# Altium footprint library Troposphere_lib.PcbLib: 48 footprints (part 2 of 3)
Each footprint in its own frame and in the unit in brackets; x right, y up, seen from the top. Pads: shape width x height; smd on the part's side, far side on the other; paste and mask are expansions set on the pad; w line width, h text height; cw(c..) or ccw(c..) is an arc to the next point about the centre after c.
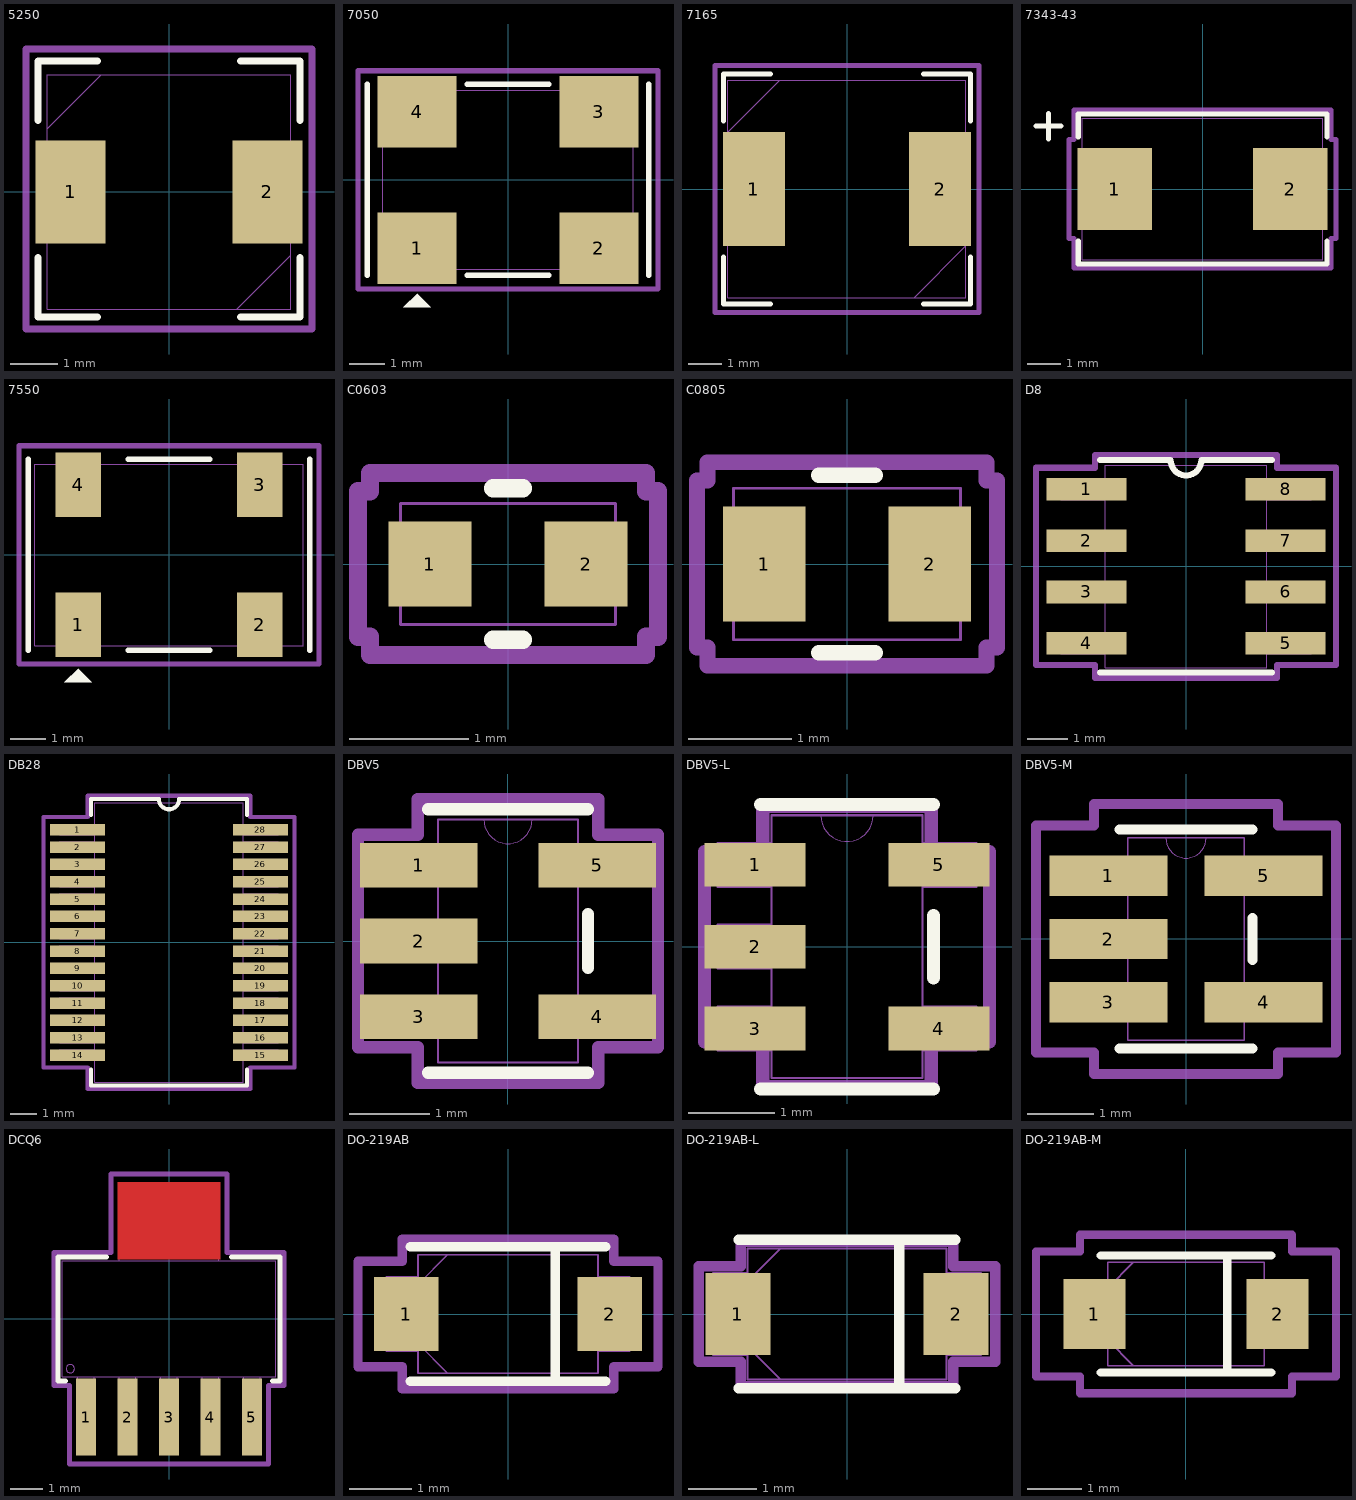
[diagram p1: the footprints below, top view; thin cyan lines are the x and y axes]

## 5250 [mm]
pads (2):
  rect 1.5x2.2 smd mask+0: 1(-2.1,0) 2(2.1,0)
Top Overlay:
  lines w0.152: -2.794,-1.397 -2.794,-2.667 -1.524,-2.667 ; -2.794,1.524 -2.794,2.794 -1.524,2.794 ; 1.524,-2.667 2.794,-2.667 2.794,-1.397 ; 1.524,2.794 2.794,2.794 2.794,1.524
Mechanical 13:
  lines w0.025: -2.6,1.35 -1.45,2.5 ; 1.45,-2.5 2.6,-1.35 ; -2.6,-2.5 2.6,-2.5 2.6,2.5 -2.6,2.5 -2.6,-2.5
Mechanical 15:
  lines w0.152: -3.048,-2.921 -3.048,3.048 3.048,3.048 3.048,-2.921 -3.048,-2.921
3D body: height 3, standoff 0, extent -2.6,-2.5 2.6,2.5

## 7050 [mm]
pads (4):
  rect 2.2x2 smd mask+0: 1(-2.54,-1.905) 2(2.54,-1.905) 3(2.54,1.905) 4(-2.54,1.905)
Top Overlay:
  region: -2.54,-3.175 -2.921,-3.556 -2.159,-3.556
  region: -2.54,-3.175
  lines w0.152: -3.937,-2.667 -3.937,2.667 ; -1.143,-2.667 1.143,-2.667 ; -1.143,2.667 1.143,2.667 ; 3.937,-2.667 3.937,2.667
Mechanical 13:
  lines w0.025: -3.5,-2.5 -3.5,2.5 3.5,2.5 3.5,-2.5 -3.5,-2.5
Mechanical 15:
  lines w0.152: -4.191,-3.048 -4.191,3.048 -3.048,3.048 4.191,3.048 4.191,-3.048 -4.191,-3.048
3D body: height 0.9, standoff 0, extent -3.5,-2.5 3.5,2.5

## 7165 [mm]
pads (2):
  rect 1.85x3.4 smd mask+0: 1(-2.775,0) 2(2.775,0)
Top Overlay:
  lines w0.152: -3.683,-2.032 -3.683,-3.429 -2.286,-3.429 ; -3.683,2.032 -3.683,3.429 -2.286,3.429 ; 2.286,-3.429 3.683,-3.429 3.683,-2.032 ; 2.286,3.429 3.683,3.429 3.683,2.032
Mechanical 13:
  lines w0.025: -3.556,1.7 -2.006,3.25 ; 2,-3.25 3.55,-1.7 ; -3.556,-3.25 -3.556,3.25 3.55,3.25 3.55,-3.25 -3.556,-3.25
Mechanical 15:
  lines w0.152: -3.937,-3.683 3.937,-3.683 3.937,3.683 -3.937,3.683 -3.937,-3.683
3D body: height 3, standoff 0, extent -3.556,-3.25 3.55,3.25

## 7343-43 [mil]
pads (2):
  rect 89x98 smd paste+0 mask+0: 1(-105,0) 2(105,0)
Top Overlay:
  lines w6: -199,75 -169,75 ; -184,60 -184,90 ; -148.5,-62.1 -148.5,-89.5 148.5,-89.5 148.5,-62.1 ; -148.5,62.1 -148.5,89.5 148.5,89.5 148.5,62.1
Mechanical 13:
  lines w1: -199,75 -169,75 ; -184,60 -184,90 ; -143.5,-84.5 143.5,-84.5 143.5,84.5 -143.5,84.5 -143.5,-84.5
Mechanical 15:
  lines w6: -159.5,-59 -159.5,59 -153.5,59 -153.5,94.5 153.5,94.5 153.5,59 159.5,59 159.5,-59 153.5,-59 153.5,-94.5 -153.5,-94.5 -153.5,-59 -159.5,-59
3D body "PCAP7343-43_Kemet.stp": height 159.02, standoff 0, extent -143.5,-84.48 143.51,84.5

## 7550 [mm]
pads (4):
  rect 1.27x1.8 smd mask+0: 1(-2.54,-1.955) 2(2.54,-1.955) 3(2.54,1.955) 4(-2.54,1.955)
Top Overlay:
  region: -2.54,-3.175
  region: -2.54,-3.175 -2.921,-3.556 -2.159,-3.556
  lines w0.152: -3.937,-2.667 -3.937,2.667 ; -1.143,-2.667 1.143,-2.667 ; -1.143,2.667 1.143,2.667 ; 3.937,-2.667 3.937,2.667
Mechanical 13:
  lines w0.025: -3.75,-2.54 3.75,-2.54 3.75,2.54 -3.75,2.54 -3.75,-2.54
Mechanical 15:
  lines w0.152: -4.191,-3.048 -4.191,3.048 -3.048,3.048 4.191,3.048 4.191,-3.048 -4.191,-3.048
3D body: height 2, standoff 0.5, extent -3.25,-2.04 3.25,2.04
3D body: height 0.5, standoff 0, extent -3.75,-2.54 3.75,2.54

## C0603 [mil]
pads (2):
  rect 27.5x28 smd paste+0 mask+0: 1(-25.75,0) 2(25.75,0)
Top Overlay:
  lines w6: -4.89,-25 4.89,-25 ; -4.89,25 4.89,25
Mechanical 13:
  lines w1: -35.5,-20 35.5,-20 35.5,20 -35.5,20 -35.5,-20
Mechanical 15:
  lines w6: -49.5,-24 -49.5,24 -45.5,24 -45.5,30 45.5,30 45.5,24 49.5,24 49.5,-24 45.5,-24 45.5,-30 -45.5,-30 -45.5,-24 -49.5,-24
3D body "CAP_K1.stp": height 35.98, standoff 0, extent -35.5,-19.99 35.52,20.01

## C0805 [mil]
pads (2):
  rect 31.5x44 smd paste+0 mask+0: 1(-31.75,0) 2(31.75,0)
Top Overlay:
  lines w6: -10.75,-34 10.75,-34 ; -10.75,34 10.75,34
Mechanical 13:
  lines w1: -43.5,-29 -43.5,29 43.5,29 43.5,-29 -43.5,-29
Mechanical 15:
  lines w6: -57.5,-32 -53.5,-32 -53.5,-39 53.5,-39 53.5,-32 57.5,-32 57.5,32 53.5,32 53.5,39 -53.5,39 -53.5,32 -57.5,32 -57.5,-32
3D body "CAP_J2.stp": height 52.01, standoff 0, extent -43.5,-29.01 43.51,29.02

## D8 [mil]
pads (8):
  rect 78x22 smd paste+0 mask+0: 1(-97,75) 2(-97,25) 3(-97,-25) 4(-97,-75) 5(97,-75) 6(97,-25) 7(97,25) 8(97,75)
Top Overlay:
  lines w6: -83.5,-103.5 83.5,-103.5 ; -83.5,103.5 -15,103.5 ccw(c0,103.5) 15,103.5 83.5,103.5
Mechanical 13:
  lines w1: -122,-85 -122,-65 -78.5,-65 -78.5,-85 -122,-85 ; -122,-35 -122,-15 -78.5,-15 -78.5,-35 -122,-35 ; -122,15 -122,35 -78.5,35 -78.5,15 -122,15 ; -122,65 -122,85 -78.5,85 -78.5,65 -122,65 ; -78.5,-98.5 78.5,-98.5 78.5,98.5 -78.5,98.5 -78.5,-98.5 ; 78.5,-85 78.5,-65 122,-65 122,-85 78.5,-85 ; 78.5,-35 78.5,-15 122,-15 122,-35 78.5,-35 ; 78.5,15 78.5,35 122,35 122,15 78.5,15 ; 78.5,65 78.5,85 122,85 122,65 78.5,65
Mechanical 15:
  lines w6: -146,-96 -146,96 -88.5,96 -88.5,108.5 88.5,108.5 88.5,96 146,96 146,-96 88.5,-96 88.5,-108.5 -88.5,-108.5 -88.5,-96 -146,-96
3D body "D8.stp": height 69.09, standoff 0, extent -122,-98.5 122.01,98.51

## DB28 [mil]
pads (28):
  rect 81x17 smd paste+0 mask+0: 1(-135,166.34) 2(-135,140.75) 3(-135,115.16) 4(-135,89.57) 5(-135,63.98) 6(-135,38.39) 7(-135,12.8) 8(-135,-12.8) 9(-135,-38.39) 10(-135,-63.98) 11(-135,-89.57) 12(-135,-115.16) 13(-135,-140.75) 14(-135,-166.34) 15(135,-166.34) 16(135,-140.75) 17(135,-115.16) 18(135,-89.57) 19(135,-63.98) 20(135,-38.39) 21(135,-12.8) 22(135,12.8) 23(135,38.39) 24(135,63.98) 25(135,89.57) 26(135,115.16) 27(135,140.75) 28(135,166.34)
Top Overlay:
  lines w6: -115,-187.94 -115,-211.5 115,-211.5 115,-187.94 ; -115,187.94 -115,211.5 -15,211.5 ccw(c0,211.5) 15,211.5 115,211.5 115,187.94
Mechanical 13:
  lines w1: -161.5,-173.84 -161.5,-158.84 -110,-158.84 -110,-173.84 -161.5,-173.84 ; -161.5,-148.25 -161.5,-133.25 -110,-133.25 -110,-148.25 -161.5,-148.25 ; -161.5,-122.66 -161.5,-107.66 -110,-107.66 -110,-122.66 -161.5,-122.66 ; -161.5,-97.07 -161.5,-82.07 -110,-82.07 -110,-97.07 -161.5,-97.07 ; -161.5,-71.48 -161.5,-56.48 -110,-56.48 -110,-71.48 -161.5,-71.48 ; -161.5,-45.89 -161.5,-30.89 -110,-30.89 -110,-45.89 -161.5,-45.89 ; -161.5,-20.3 -161.5,-5.3 -110,-5.3 -110,-20.3 -161.5,-20.3 ; -161.5,5.3 -161.5,20.3 -110,20.3 -110,5.3 -161.5,5.3 ; -161.5,30.89 -161.5,45.89 -110,45.89 -110,30.89 -161.5,30.89 ; -161.5,56.48 -161.5,71.48 -110,71.48 -110,56.48 -161.5,56.48 ; -161.5,82.07 -161.5,97.07 -110,97.07 -110,82.07 -161.5,82.07 ; -161.5,107.66 -161.5,122.66 -110,122.66 -110,107.66 -161.5,107.66 ; -161.5,133.25 -161.5,148.25 -110,148.25 -110,133.25 -161.5,133.25 ; -161.5,158.84 -161.5,173.84 -110,173.84 -110,158.84 -161.5,158.84 ; -110,-206.5 110,-206.5 110,206.5 -110,206.5 -110,-206.5 ; 110,-173.84 110,-158.84 161.5,-158.84 161.5,-173.84 110,-173.84 ; 110,-148.25 110,-133.25 161.5,-133.25 161.5,-148.25 110,-148.25 ; 110,-122.66 110,-107.66 161.5,-107.66 161.5,-122.66 110,-122.66 ; 110,-97.07 110,-82.07 161.5,-82.07 161.5,-97.07 110,-97.07 ; 110,-71.48 110,-56.48 161.5,-56.48 161.5,-71.48 110,-71.48 ; 110,-45.89 110,-30.89 161.5,-30.89 161.5,-45.89 110,-45.89 ; 110,-20.3 110,-5.3 161.5,-5.3 161.5,-20.3 110,-20.3 ; 110,5.3 110,20.3 161.5,20.3 161.5,5.3 110,5.3 ; 110,30.89 110,45.89 161.5,45.89 161.5,30.89 110,30.89 ; 110,56.48 110,71.48 161.5,71.48 161.5,56.48 110,56.48 ; 110,82.07 110,97.07 161.5,97.07 161.5,82.07 110,82.07 ; 110,107.66 110,122.66 161.5,122.66 161.5,107.66 110,107.66 ; 110,133.25 110,148.25 161.5,148.25 161.5,133.25 110,133.25 ; 110,158.84 110,173.84 161.5,173.84 161.5,158.84 110,158.84
Mechanical 15:
  lines w6: -185.5,-184.84 -185.5,184.84 -120,184.84 -120,216.5 120,216.5 120,184.84 185.5,184.84 185.5,-184.84 120,-184.84 120,-216.5 -120,-216.5 -120,-184.84 -185.5,-184.84
3D body "DB28.stp": height 79.09, standoff 0, extent -161.49,-206.49 161.51,206.5

## DBV5 [mil]
pads (5):
  rect 58x22 smd paste+0 mask+0: 1(-44,37.4) 2(-44,0) 3(-44,-37.4) 4(44,-37.4) 5(44,37.4)
Top Overlay:
  lines w6: -39.5,-65 39.5,-65 ; -39.5,65 39.5,65 ; 39.5,-13.3 39.5,13.3
Mechanical 13:
  lines w0: -12,60 ccw(c0,60) 12,60
  lines w1: -59,-47.4 -34.5,-47.4 -34.5,-27.4 -59,-27.4 -59,-47.4 ; -59,-10 -34.5,-10 -34.5,10 -59,10 -59,-10 ; -59,27.4 -34.5,27.4 -34.5,47.4 -59,47.4 -59,27.4 ; -34.5,-60 -34.5,60 34.5,60 34.5,-60 -34.5,-60 ; 34.5,-47.4 59,-47.4 59,-27.4 34.5,-27.4 34.5,-47.4 ; 34.5,27.4 59,27.4 59,47.4 34.5,47.4 34.5,27.4
Mechanical 15:
  lines w6: -74,-52.4 -74,52.4 -44.5,52.4 -44.5,70 44.5,70 44.5,52.4 74,52.4 74,-52.4 44.5,-52.4 44.5,-70 -44.5,-70 -44.5,-52.4 -74,-52.4
3D body "DBV5.stp": height 57.09, standoff 0, extent -59.01,-59.99 59.02,60.01

## DBV5-L [mil]
pads (5):
  rect 46x20 smd paste+0 mask+0: 1(-42,37.4) 2(-42,0) 3(-42,-37.4) 4(42,-37.4) 5(42,37.4)
Top Overlay:
  lines w6: -39.5,-65 39.5,-65 ; -39.5,65 39.5,65 ; 39.5,-14.3 39.5,14.3
Mechanical 13:
  lines w0: -12,60 ccw(c0,60) 12,60
  lines w1: -59,-47.4 -34.5,-47.4 -34.5,-27.4 -59,-27.4 -59,-47.4 ; -59,-10 -34.5,-10 -34.5,10 -59,10 -59,-10 ; -59,27.4 -34.5,27.4 -34.5,47.4 -59,47.4 -59,27.4 ; -34.5,-60 -34.5,60 34.5,60 34.5,-60 -34.5,-60 ; 34.5,-47.4 59,-47.4 59,-27.4 34.5,-27.4 34.5,-47.4 ; 34.5,27.4 59,27.4 59,47.4 34.5,47.4 34.5,27.4
Mechanical 15:
  lines w6: -65,-43.4 -65,43.4 -38.5,43.4 -38.5,64 38.5,64 38.5,43.4 65,43.4 65,-43.4 38.5,-43.4 38.5,-64 -38.5,-64 -38.5,-43.4 -65,-43.4
3D body "DBV5-L.stp": height 57.09, standoff 0, extent -59.01,-59.99 59.02,60.01

## DBV5-M [mil]
pads (5):
  rect 70x24 smd paste+0 mask+0: 1(-46,37.4) 2(-46,0) 3(-46,-37.4) 4(46,-37.4) 5(46,37.4)
Top Overlay:
  lines w6: -39.5,-65 39.5,-65 ; -39.5,65 39.5,65 ; 39.5,-12.3 39.5,12.3
Mechanical 13:
  lines w0: -12,60 ccw(c0,60) 12,60
  lines w1: -59,-47.4 -34.5,-47.4 -34.5,-27.4 -59,-27.4 -59,-47.4 ; -59,-10 -34.5,-10 -34.5,10 -59,10 -59,-10 ; -59,27.4 -34.5,27.4 -34.5,47.4 -59,47.4 -59,27.4 ; -34.5,-60 -34.5,60 34.5,60 34.5,-60 -34.5,-60 ; 34.5,-47.4 59,-47.4 59,-27.4 34.5,-27.4 34.5,-47.4 ; 34.5,27.4 59,27.4 59,47.4 34.5,47.4 34.5,27.4
Mechanical 15:
  lines w6: -89,-67.4 -89,67.4 -54.5,67.4 -54.5,80 54.5,80 54.5,67.4 89,67.4 89,-67.4 54.5,-67.4 54.5,-80 -54.5,-80 -54.5,-67.4 -89,-67.4
3D body "DBV5-M.stp": height 57.09, standoff 0, extent -59.01,-60 59.02,60

## DCQ6 [mil]
pads (5):
  rect 24x93 smd paste+0 mask+0: 1(-100,-118.5) 2(-50,-118.5) 3(0,-118.5) 4(50,-118.5) 5(100,-118.5)
Top Layer:
  region: 62,72 62,165 -62,165 -62,72
Top Overlay:
  lines w6: -125.1,-75 -134,-75 -134,75 -75.1,75 ; 75.1,75 134,75 134,-75 125.1,-75
Top Paste:
  region: 62,72 62,165 -62,165 -62,72
Top Solder:
  region: 64,54 64,187 -64,187 -64,54
Mechanical 13:
  circle w0: c-119,-60 r5
  lines w1: -129,-70 129,-70 129,70 -129,70 -129,-70 ; -110,-143 -110,-70 -90,-70 -90,-143 -110,-143 ; -60,-143 -60,-70 -40,-70 -40,-143 -60,-143 ; -60,70 60,70 60,143 -60,143 -60,70 ; -10,-143 -10,-70 10,-70 10,-143 -10,-143 ; 40,-143 40,-70 60,-70 60,-143 40,-143 ; 90,-143 90,-70 110,-70 110,-143 90,-143
Mechanical 15:
  lines w6: -139,-80 -139,80 -70,80 -70,175 70,175 70,80 139,80 139,-80 120,-80 120,-175 -120,-175 -120,-80 -139,-80
3D body "DCQ6-M.stp": height 71.1, standoff 0, extent -129.01,-142.98 129.02,143

## DO-219AB [mil]
pads (2):
  rect 41x47 smd paste+0 mask+0: 1(-64.5,0) 2(64.5,0)
Top Overlay:
  lines w6: -62,-42.5 62,-42.5 ; -62,42.5 62,42.5 ; 30,-42.5 30,42.5
Mechanical 13:
  lines w1: -57,-18.75 -38.25,-37.5 ; -57,18.75 -38.25,37.5 ; -77,-23.5 -77,23.5 -57,23.5 -57,-23.5 -77,-23.5 ; -57,-37.5 57,-37.5 57,37.5 -57,37.5 -57,-37.5 ; 57,-23.5 57,23.5 77,23.5 77,-23.5 57,-23.5
Mechanical 15:
  lines w6: -95,-33.5 -95,33.5 -67,33.5 -67,47.5 67,47.5 67,33.5 95,33.5 95,-33.5 67,-33.5 67,-47.5 -67,-47.5 -67,-33.5 -95,-33.5
3D body "DO-219AB.stp": height 32.24, standoff 0, extent -77,-37.48 77.02,37.49

## DO-219AB-L [mil]
pads (2):
  rect 37x47 smd paste+0 mask+0: 1(-62.5,0) 2(62.5,0)
Top Overlay:
  lines w6: -62,-42.5 62,-42.5 ; -62,42.5 62,42.5 ; 30,-42.5 30,42.5
Mechanical 13:
  lines w1: -57,-18.75 -38.25,-37.5 ; -57,18.75 -38.25,37.5 ; -77,-23.5 -77,23.5 -57,23.5 -57,-23.5 -77,-23.5 ; -57,-37.5 57,-37.5 57,37.5 -57,37.5 -57,-37.5 ; 57,-23.5 57,23.5 77,23.5 77,-23.5 57,-23.5
Mechanical 15:
  lines w6: -85,-27.5 -85,27.5 -61,27.5 -61,41.5 61,41.5 61,27.5 85,27.5 85,-27.5 61,-27.5 61,-41.5 -61,-41.5 -61,-27.5 -85,-27.5
3D body "DO-219AB-L.stp": height 32.24, standoff 0, extent -77,-37.47 77.01,37.49

## DO-219AB-M [mil]
pads (2):
  rect 45x51 smd paste+0 mask+0: 1(-66.5,0) 2(66.5,0)
Top Overlay:
  lines w6: -62,-42.5 62,-42.5 ; -62,42.5 62,42.5 ; 30,-42.5 30,42.5
Mechanical 13:
  lines w1: -57,-18.75 -38.25,-37.5 ; -57,18.75 -38.25,37.5 ; -77,-23.5 -57,-23.5 -57,23.5 -77,23.5 -77,-23.5 ; -57,-37.5 -57,37.5 57,37.5 57,-37.5 -57,-37.5 ; 57,-23.5 77,-23.5 77,23.5 57,23.5 57,-23.5
Mechanical 15:
  lines w6: -109,-45.5 -77,-45.5 -77,-57.5 77,-57.5 77,-45.5 109,-45.5 109,45.5 77,45.5 77,57.5 -77,57.5 -77,45.5 -109,45.5 -109,-45.5
3D body "DO-219AB-M.stp": height 32.24, standoff 0, extent -77,-37.48 77.02,37.49